# Altium footprint library TarabusLibrary.PcbLib: 591 footprints (part 10 of 37)
Each footprint in its own frame and in the unit in brackets; x right, y up, seen from the top. Pads: shape width x height; smd on the part's side, far side on the other; paste and mask are expansions set on the pad; w line width, h text height; cw(c..) or ccw(c..) is an arc to the next point about the centre after c.
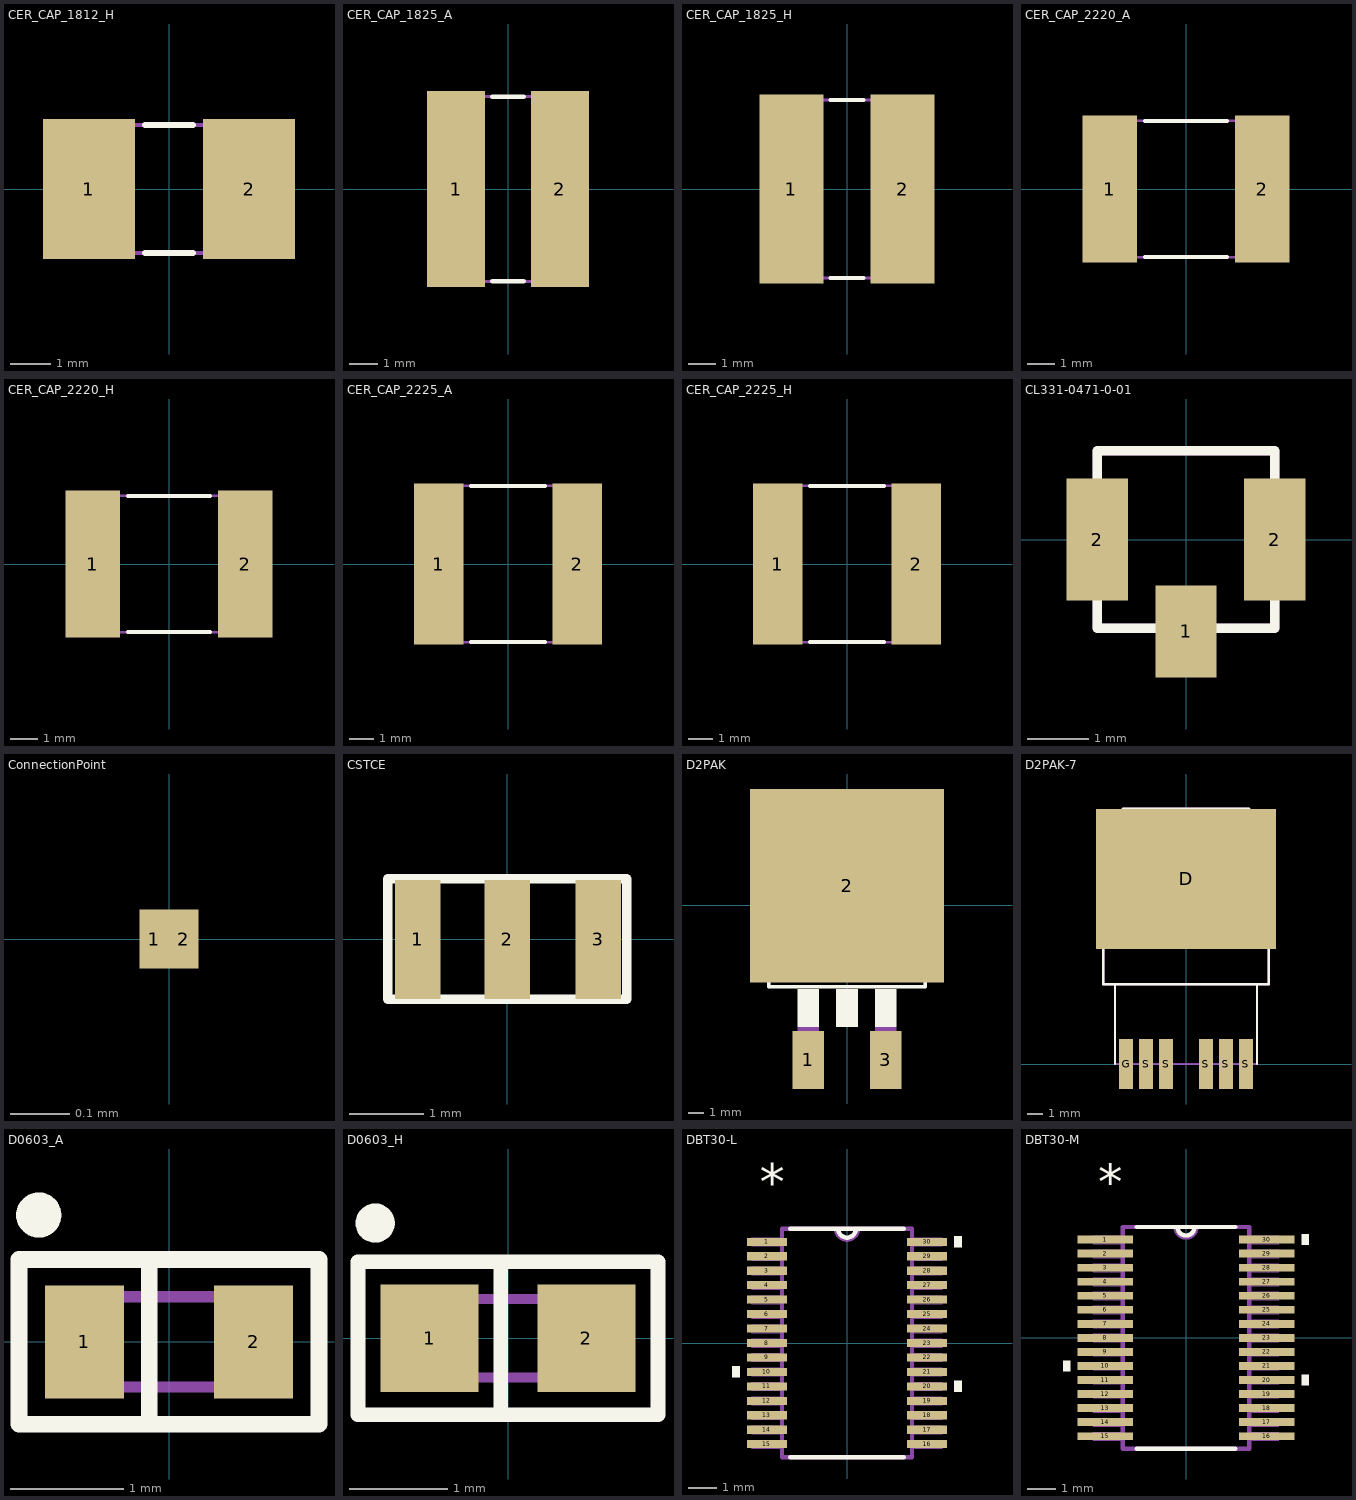
[diagram p9: the footprints below, top view; thin cyan lines are the x and y axes]

## CER_CAP_1812_H [mm]
height 1.7
pads (2):
  rect 2.3x3.5 smd: 1(-2,0) 2(2,0)
Top Overlay:
  lines w0.15: -0.6,-1.6 0.6,-1.6 ; -0.6,1.6 0.6,1.6
Mechanical 7:
  lines w0.1: -2.25,-1.6 -2.25,1.6 2.25,1.6 2.25,-1.6 -2.25,-1.6
Mechanical 10:
  text ".Comment" at -0.63,-2.52 h0.6
  text ".Designator" at -0.62,2.14 h0.8
3D body: height 1.7, standoff 0, extent -2.25,-1.6 2.25,1.6

## CER_CAP_1825_A [mm]
height 1.7
pads (2):
  rect 2x6.8 smd: 1(-1.8,0) 2(1.8,0)
Top Overlay:
  lines w0.15: -0.55,-3.2 0.55,-3.2 ; -0.55,3.2 0.55,3.2
Mechanical 7:
  lines w0.1: -2.25,-3.2 -2.25,3.2 2.25,3.2 2.25,-3.2 -2.25,-3.2
Mechanical 10:
  text ".Comment" at -0.58,-4.11 h0.6
  text ".Designator" at -0.69,3.88 h0.8
3D body: height 1.7, standoff 0, extent -2.25,-3.2 2.25,3.2

## CER_CAP_1825_H [mm]
height 1.7
pads (2):
  rect 2.3x6.8 smd: 1(-2,0) 2(2,0)
Top Overlay:
  lines w0.15: -0.6,-3.2 0.6,-3.2 ; -0.6,3.2 0.6,3.2
Mechanical 7:
  lines w0.1: -2.25,-3.2 2.25,-3.2 2.25,3.2 -2.25,3.2 -2.25,-3.2
Mechanical 10:
  text ".Designator" at -0.69,3.88 h0.8
  text ".Comment" at -0.62,-4.23 h0.6
3D body: height 1.7, standoff 0, extent -2.25,-3.2 2.25,3.2

## CER_CAP_2220_A [mm]
height 1.8
pads (2):
  rect 2x5.4 smd: 1(-2.8,0) 2(2.8,0)
Top Overlay:
  lines w0.15: -1.5,-2.5 1.5,-2.5 ; -1.5,2.5 1.5,2.5
Mechanical 7:
  lines w0.1: -2.8,-2.5 -2.8,2.5 2.8,2.5 2.8,-2.5 -2.8,-2.5
Mechanical 10:
  text ".Designator" at -0.56,3.04 h0.8
  text ".Comment" at -0.5,-3.49 h0.6
3D body: height 1.8, standoff 0, extent -2.8,-2.5 2.8,2.5

## CER_CAP_2220_H [mm]
height 1.8
pads (2):
  rect 2x5.4 smd: 1(-2.8,0) 2(2.8,0)
Top Overlay:
  lines w0.15: -1.5,-2.5 1.5,-2.5 ; -1.5,2.5 1.5,2.5
Mechanical 7:
  lines w0.1: -2.8,-2.5 -2.8,2.5 2.8,2.5 2.8,-2.5 -2.8,-2.5
Mechanical 10:
  text ".Designator" at -0.56,3.04 h0.8
  text ".Comment" at -0.47,-3.45 h0.6
3D body: height 1.8, standoff 0, extent -2.8,-2.5 2.8,2.5

## CER_CAP_2225_A [mm]
height 2
pads (2):
  rect 2x6.5 smd: 1(-2.8,0) 2(2.8,0)
Top Overlay:
  lines w0.15: -1.5,-3.15 1.5,-3.15 ; -1.5,3.15 1.5,3.15
Mechanical 7:
  lines w0.1: -2.8,-3.15 -2.8,3.15 2.8,3.15 2.8,-3.15 -2.8,-3.15
Mechanical 10:
  text ".Comment" at -0.46,-4 h0.6
  text ".Designator" at -0.59,3.58 h0.8
3D body: height 2, standoff 0, extent -2.8,-3.15 2.8,3.15

## CER_CAP_2225_H [mm]
height 2
pads (2):
  rect 2x6.5 smd: 1(-2.8,0) 2(2.8,0)
Top Overlay:
  lines w0.15: -1.5,-3.15 1.5,-3.15 ; -1.5,3.15 1.5,3.15
Mechanical 7:
  lines w0.1: -2.8,-3.15 -2.8,3.15 2.8,3.15 2.8,-3.15 -2.8,-3.15
Mechanical 10:
  text ".Designator" at -0.59,3.58 h0.8
  text ".Comment" at -0.42,-3.91 h0.6
3D body: height 2, standoff 0, extent -2.8,-3.15 2.8,3.15

## CL331-0471-0-01 [mm]
pads (3):
  rect 1x1.5 smd mask+0: 1(0,-1.5)
  rect 1x2 smd mask+0: 2(-1.45,0) 2(1.45,0)
Top Overlay:
  lines w0.15: -0.5,-1.45 -1.45,-1.45 -1.45,1.45 1.45,1.45 1.45,-1.45 0.5,-1.45
Mechanical 7:
  lines w0.15: -0.5,-1.45 -1.45,-1.45 -1.45,1.45 1.45,1.45 1.45,-1.45 0.5,-1.45
3D body "User Library-CL331-0471-0-01.STEP": height 1.3, standoff -0.05, extent -1.45,-1.45 1.45,1.45

## ConnectionPoint [mm]
pads (2):
  rect 0.05x0.1 smd paste+0 mask-0.1: 1(-0.025,0) 2(0.025,0)

## CSTCE [mil]
pads (3):
  rect 24x63 smd: 1(-47.24,0) 2(0,0) 3(48,0)
Top Overlay:
  lines w5: -62.99,-31.5 63,-31.5 63,32 -62.99,32 -62.99,-31.5

## D2PAK [mil]
pads (3):
  rect 82x150 smd: 1(-100,-400) 3(100,-400)
  rect 500x500 smd: 2(0,50)
Top Overlay:
  rectangle: -28,-315 28,-217
  rectangle: 72,-315 128,-217
  rectangle: -128,-315 -72,-217
  lines w10: -202,-141 -202,-211 202,-211 202,-141
Mechanical 16:
  rectangle: 72,-371 128,-315
  rectangle: 78,-425 122,-369
  rectangle: -128,-371 -72,-315
  rectangle: -122,-425 -78,-369
  lines w10: -202,-211 -202,125 ; 202,-211 202,125 ; -202,125 202,125 ; -202,125 -202,135 -133,179 123,179 202,125

## D2PAK-7 [mm]
pads (7):
  rect 11.43x8.89 smd: D(0,11.76)
  rect 0.9x3.175 smd: G(-3.81,0) S(-2.54,0) S(-1.27,0) S(1.27,0) S(2.54,0) S(3.81,0)
Top Overlay:
  lines w0.15: -5.25,14.97 -5.25,5.08 5.25,5.08 5.25,14.97 ; -4.51,0 -4.51,5.08 ; 4.51,0 4.51,5.08 ; -5.258,14.97 5.232,14.97 3.962,16.24 -3.988,16.24 -5.258,14.97
Mechanical 7:
  lines w0.15: -5.25,14.97 -5.25,5.08 5.25,5.08 5.25,14.97 ; -4.51,5.08 -4.51,0 4.51,0 4.51,5.08 ; -5.258,14.97 -3.988,16.24 3.962,16.24 5.232,14.97 -5.258,14.97
Mechanical 10:
  text ".Designator" at -1.3,-2.8 h0.7
  text ".Comment" at -1.3,17 h0.7
3D body "User Library-D2PAK-7_4_1.STEP": height 4.5, standoff 0, extent -5.2,-0.069 5.2,15.599

## D0603_A [mm]
height 1.1
pads (2):
  rect 0.7x1 smd: 1(-0.75,0) 2(0.75,0)
Top Overlay:
  circle w0.2: c-1.155,1.125 r0.1
  lines w0.15: -0.175,-0.73 -0.175,0.73 ; -1.33,-0.73 1.33,-0.73 1.33,0.73 -1.33,0.73 -1.33,-0.73
Mechanical 7:
  lines w0.1: -0.7,-0.4 -0.7,0.4 ; -0.6,-0.4 -0.6,0.4 ; -0.5,-0.4 -0.5,0.4 ; -0.8,-0.4 -0.8,0.4 0.8,0.4 0.8,-0.4 -0.8,-0.4
Mechanical 10:
  text ".Designator" at -0.62,1 h0.8
  text ".Comment" at -0.75,-1.28 h0.6
3D body: height 1.1, standoff 0, extent -0.8,-0.4 0.8,0.4

## D0603_H [mm]
height 1.1
pads (2):
  rect 1x1.1 smd: 1(-0.8,0) 2(0.8,0)
Top Overlay:
  circle w0.2: c-1.355,1.175 r0.1
  lines w0.15: -0.075,-0.78 -0.075,0.78 ; -1.53,-0.78 -1.53,0.78 1.53,0.78 1.53,-0.78 -1.53,-0.78
Mechanical 7:
  lines w0.1: -0.7,-0.4 -0.7,0.4 ; -0.6,-0.4 -0.6,0.4 ; -0.5,-0.4 -0.5,0.4 ; -0.8,-0.4 0.8,-0.4 0.8,0.4 -0.8,0.4 -0.8,-0.4
Mechanical 10:
  text ".Designator" at -0.62,1 h0.8
  text ".Comment" at -0.61,-1.33 h0.6
3D body: height 1.1, standoff 0, extent -0.8,-0.4 0.8,0.4

## DBT30-L [mil]
height 47
pads (30):
  rect 54x11 smd: 1(-109,137.8) 2(-109,118.11) 3(-109,98.43) 4(-109,78.74) 5(-109,59.06) 6(-109,39.37) 7(-109,19.68) 8(-109,0) 9(-109,-19.69) 10(-109,-39.37) 11(-109,-59.06) 12(-109,-78.74) 13(-109,-98.43) 14(-109,-118.11) 15(-109,-137.8) 16(109,-137.8) 17(109,-118.11) 18(109,-98.43) 19(109,-78.74) 20(109,-59.06) 21(109,-39.37) 22(109,-19.68) 23(109,0) 24(109,19.69) 25(109,39.37) 26(109,59.06) 27(109,78.74) 28(109,98.43) 29(109,118.11) 30(109,137.8)
Top Overlay:
  region: 146,145.3 156,145.3 156,130.3 146,130.3
  region: 146,-51.56 156,-51.56 156,-66.56 146,-66.56
  region: -146,-31.87 -156,-31.87 -156,-46.87 -146,-46.87
  lines w6: -77.24,-155.5 77.24,-155.5 ; -77.24,155.5 77.24,155.5 ; -12,155.5 ccw(c0,155.5) 12,155.5
  text "*" at -119,193.8 h50
Mechanical 1:
  lines w0: -12,155.5 ccw(c0,155.5) 12,155.5 ; -130,-143.3 -88.5,-143.3 -88.5,-132.3 -130,-132.3 -130,-143.3 ; -130,-123.61 -88.5,-123.61 -88.5,-112.61 -130,-112.61 -130,-123.61 ; -130,-103.93 -88.5,-103.93 -88.5,-92.93 -130,-92.93 -130,-103.93 ; -130,-84.24 -88.5,-84.24 -88.5,-73.24 -130,-73.24 -130,-84.24 ; -130,-64.56 -88.5,-64.56 -88.5,-53.56 -130,-53.56 -130,-64.56 ; -130,-44.87 -88.5,-44.87 -88.5,-33.87 -130,-33.87 -130,-44.87 ; -130,-25.19 -88.5,-25.19 -88.5,-14.19 -130,-14.19 -130,-25.19 ; -130,-5.5 -88.5,-5.5 -88.5,5.5 -130,5.5 -130,-5.5 ; -130,14.19 -88.5,14.19 -88.5,25.18 -130,25.18 -130,14.19 ; -130,33.87 -88.5,33.87 -88.5,44.87 -130,44.87 -130,33.87 ; -130,53.56 -88.5,53.56 -88.5,64.56 -130,64.56 -130,53.56 ; -130,73.24 -88.5,73.24 -88.5,84.24 -130,84.24 -130,73.24 ; -130,92.93 -88.5,92.93 -88.5,103.93 -130,103.93 -130,92.93 ; -130,112.61 -88.5,112.61 -88.5,123.61 -130,123.61 -130,112.61 ; -130,132.3 -88.5,132.3 -88.5,143.3 -130,143.3 -130,132.3 ; -88.5,-155.5 -88.5,155.5 88.5,155.5 88.5,-155.5 -88.5,-155.5 ; 88.5,-143.3 130,-143.3 130,-132.3 88.5,-132.3 88.5,-143.3 ; 88.5,-123.61 130,-123.61 130,-112.61 88.5,-112.61 88.5,-123.61 ; 88.5,-103.93 130,-103.93 130,-92.93 88.5,-92.93 88.5,-103.93 ; 88.5,-84.24 130,-84.24 130,-73.24 88.5,-73.24 88.5,-84.24 ; 88.5,-64.56 130,-64.56 130,-53.56 88.5,-53.56 88.5,-64.56 ; 88.5,-44.87 130,-44.87 130,-33.87 88.5,-33.87 88.5,-44.87 ; 88.5,-25.18 130,-25.18 130,-14.19 88.5,-14.19 88.5,-25.18 ; 88.5,-5.5 130,-5.5 130,5.5 88.5,5.5 88.5,-5.5 ; 88.5,14.19 130,14.19 130,25.19 88.5,25.19 88.5,14.19 ; 88.5,33.87 130,33.87 130,44.87 88.5,44.87 88.5,33.87 ; 88.5,53.56 130,53.56 130,64.56 88.5,64.56 88.5,53.56 ; 88.5,73.24 130,73.24 130,84.24 88.5,84.24 88.5,73.24 ; 88.5,92.93 130,92.93 130,103.93 88.5,103.93 88.5,92.93 ; 88.5,112.61 130,112.61 130,123.61 88.5,123.61 88.5,112.61 ; 88.5,132.3 130,132.3 130,143.3 88.5,143.3 88.5,132.3
  lines w6: -14.75,155.5 ccw(c0,155.5) 14.75,155.5 ; -88.5,-155.5 88.5,-155.5 88.5,155.5 -88.5,155.5 -88.5,-155.5
  text "47" at 0,0 h50
  text "*" at -119,193.8 h50

## DBT30-M [mil]
height 47
pads (30):
  rect 78x11 smd: 1(-113,137.8) 2(-113,118.11) 3(-113,98.43) 4(-113,78.74) 5(-113,59.06) 6(-113,39.37) 7(-113,19.68) 8(-113,0) 9(-113,-19.69) 10(-113,-39.37) 11(-113,-59.06) 12(-113,-78.74) 13(-113,-98.43) 14(-113,-118.11) 15(-113,-137.8) 16(113,-137.8) 17(113,-118.11) 18(113,-98.43) 19(113,-78.74) 20(113,-59.06) 21(113,-39.37) 22(113,-19.68) 23(113,0) 24(113,19.69) 25(113,39.37) 26(113,59.06) 27(113,78.74) 28(113,98.43) 29(113,118.11) 30(113,137.8)
Top Overlay:
  region: -162,-31.87 -172,-31.87 -172,-46.87 -162,-46.87
  region: 162,-51.56 172,-51.56 172,-66.56 162,-66.56
  region: 162,145.3 172,145.3 172,130.3 162,130.3
  lines w6: -69.24,-155.5 69.24,-155.5 ; -69.24,155.5 69.24,155.5 ; -12,155.5 ccw(c0,155.5) 12,155.5
  text "*" at -123,193.8 h50
Mechanical 1:
  lines w0: -12,155.5 ccw(c0,155.5) 12,155.5 ; -130,-143.3 -130,-132.3 -88.5,-132.3 -88.5,-143.3 -130,-143.3 ; -130,-123.61 -130,-112.61 -88.5,-112.61 -88.5,-123.61 -130,-123.61 ; -130,-103.93 -130,-92.93 -88.5,-92.93 -88.5,-103.93 -130,-103.93 ; -130,-84.24 -130,-73.24 -88.5,-73.24 -88.5,-84.24 -130,-84.24 ; -130,-64.56 -130,-53.56 -88.5,-53.56 -88.5,-64.56 -130,-64.56 ; -130,-44.87 -130,-33.87 -88.5,-33.87 -88.5,-44.87 -130,-44.87 ; -130,-25.19 -130,-14.19 -88.5,-14.19 -88.5,-25.19 -130,-25.19 ; -130,-5.5 -130,5.5 -88.5,5.5 -88.5,-5.5 -130,-5.5 ; -130,14.19 -130,25.18 -88.5,25.18 -88.5,14.19 -130,14.19 ; -130,33.87 -130,44.87 -88.5,44.87 -88.5,33.87 -130,33.87 ; -130,53.56 -130,64.56 -88.5,64.56 -88.5,53.56 -130,53.56 ; -130,73.24 -130,84.24 -88.5,84.24 -88.5,73.24 -130,73.24 ; -130,92.93 -130,103.93 -88.5,103.93 -88.5,92.93 -130,92.93 ; -130,112.61 -130,123.61 -88.5,123.61 -88.5,112.61 -130,112.61 ; -130,132.3 -130,143.3 -88.5,143.3 -88.5,132.3 -130,132.3 ; -88.5,-155.5 88.5,-155.5 88.5,155.5 -88.5,155.5 -88.5,-155.5 ; 88.5,-143.3 88.5,-132.3 130,-132.3 130,-143.3 88.5,-143.3 ; 88.5,-123.61 88.5,-112.61 130,-112.61 130,-123.61 88.5,-123.61 ; 88.5,-103.93 88.5,-92.93 130,-92.93 130,-103.93 88.5,-103.93 ; 88.5,-84.24 88.5,-73.24 130,-73.24 130,-84.24 88.5,-84.24 ; 88.5,-64.56 88.5,-53.56 130,-53.56 130,-64.56 88.5,-64.56 ; 88.5,-44.87 88.5,-33.87 130,-33.87 130,-44.87 88.5,-44.87 ; 88.5,-25.18 88.5,-14.19 130,-14.19 130,-25.18 88.5,-25.18 ; 88.5,-5.5 88.5,5.5 130,5.5 130,-5.5 88.5,-5.5 ; 88.5,14.19 88.5,25.19 130,25.19 130,14.19 88.5,14.19 ; 88.5,33.87 88.5,44.87 130,44.87 130,33.87 88.5,33.87 ; 88.5,53.56 88.5,64.56 130,64.56 130,53.56 88.5,53.56 ; 88.5,73.24 88.5,84.24 130,84.24 130,73.24 88.5,73.24 ; 88.5,92.93 88.5,103.93 130,103.93 130,92.93 88.5,92.93 ; 88.5,112.61 88.5,123.61 130,123.61 130,112.61 88.5,112.61 ; 88.5,132.3 88.5,143.3 130,143.3 130,132.3 88.5,132.3
  lines w6: -14.75,155.5 ccw(c0,155.5) 14.75,155.5 ; -88.5,-155.5 -88.5,155.5 88.5,155.5 88.5,-155.5 -88.5,-155.5
  text "*" at -123,193.8 h50
  text "47" at 0,0 h50